# Altium footprint library AD_Comments.PcbLib: 178 footprints (part 2 of 12)
Each footprint in its own frame and in the unit in brackets; x right, y up, seen from the top. Pads: shape width x height; smd on the part's side, far side on the other; paste and mask are expansions set on the pad; w line width, h text height; cw(c..) or ccw(c..) is an arc to the next point about the centre after c.
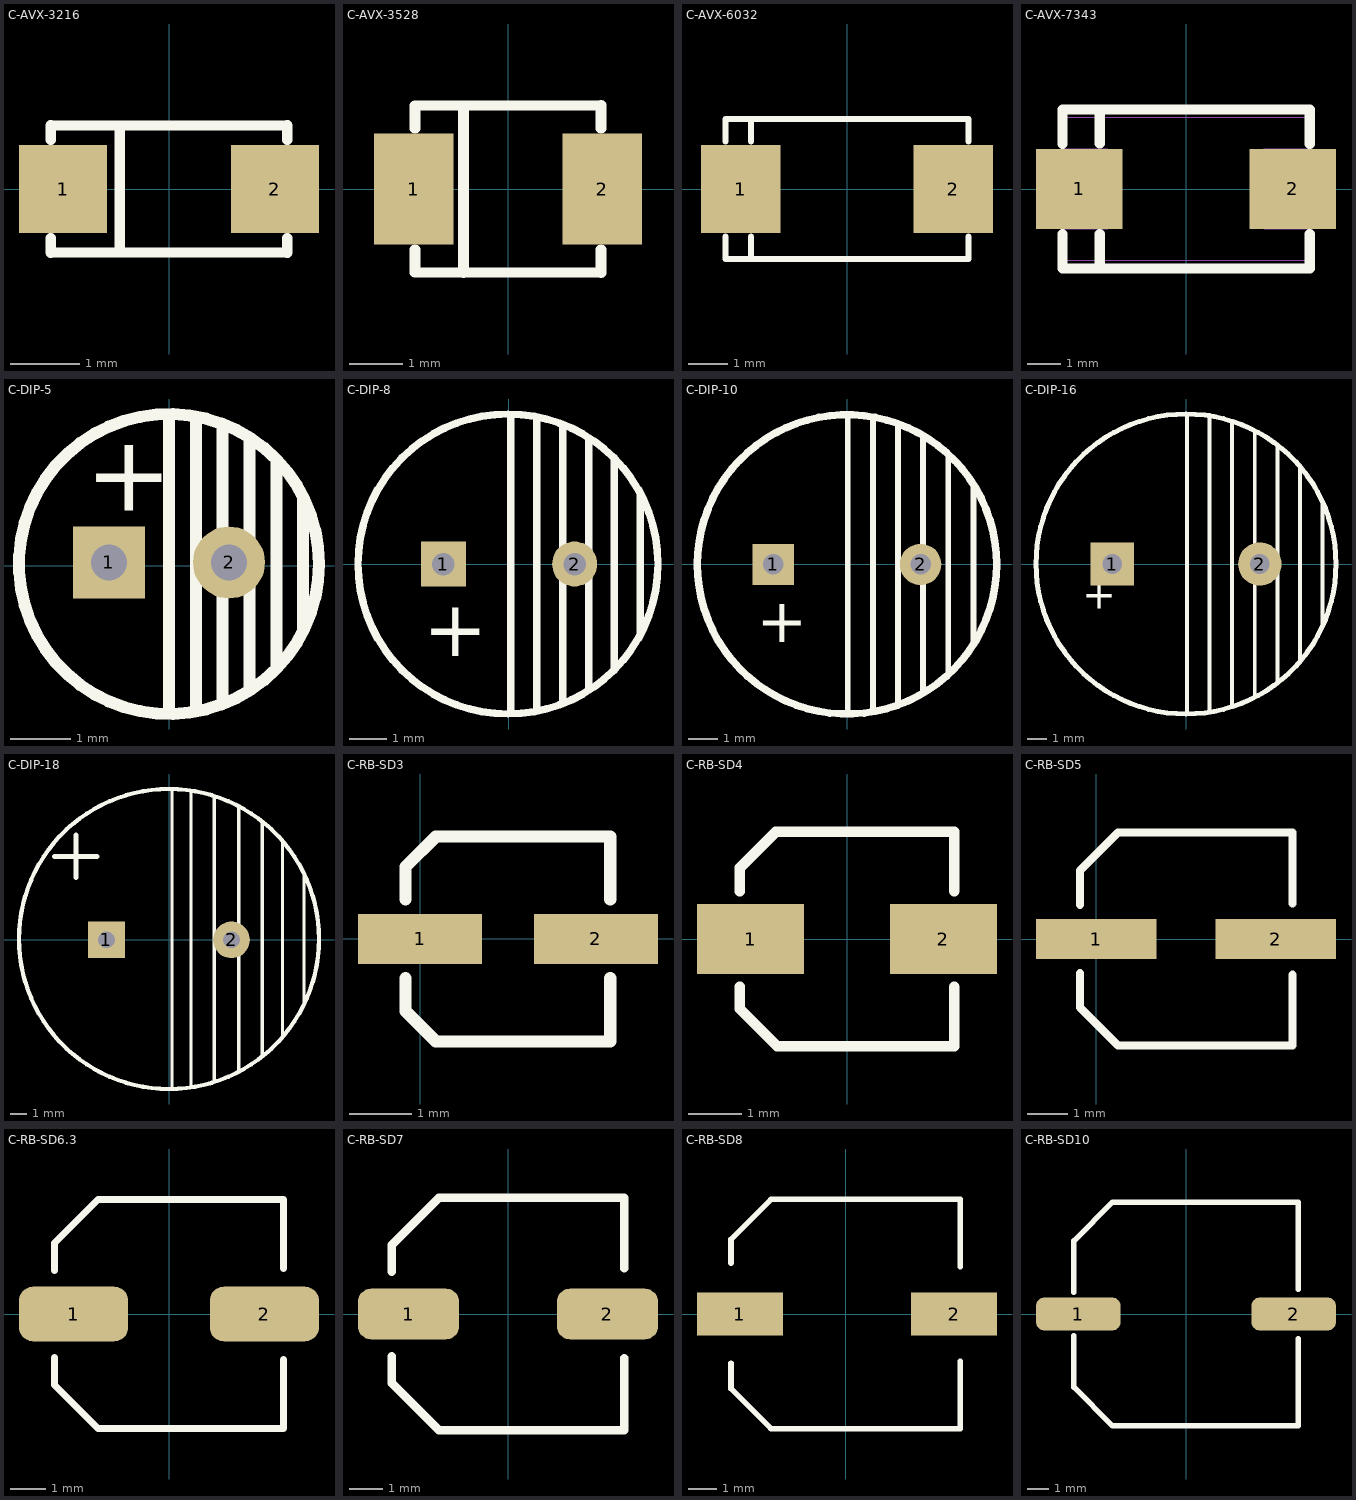
[diagram p1: the footprints below, top view; thin cyan lines are the x and y axes]

## C-AVX-3216 [mil] "钽电容3.2*1.6mm"
height 78.74
pads (2):
  rect 50x50 smd: 1(-60,0) 2(60,0)
Top Overlay:
  lines w5.91: -67,-36 67,-36 ; -67,36 67,36
  lines w6: -67,-36 -67,-28 ; -67,28 -67,36 ; -28,-35 -28,35 ; 67,-36 67,-28 ; 67,28 67,36
3D body "User Library-AVX_ACASE.step": height 67.32, standoff 0, extent -66.92,-33.06 66.94,33.08

## C-AVX-3528 [mm] "钽电容3.5*2.8mm"
height 3
pads (2):
  rect 1.5x2.1 smd: 1(-1.778,0) 2(1.778,0)
Top Overlay:
  lines w0.2: -1.753,-1.143 -1.753,-1.572 1.753,-1.578 1.753,-1.143 ; -1.753,1.143 -1.753,1.572 1.753,1.578 1.753,1.143 ; -0.838,-1.575 -0.838,1.549
3D body "User Library-AVX_BCASE.step": height 2.03, standoff 0, extent -1.85,-1.465 1.85,1.465

## C-AVX-6032 [mm] "钽电容6*3.2mm"
pads (2):
  rect 2x2.2 smd: 1(-2.667,0) 2(2.667,0)
Top Overlay:
  lines w0.152: -3.048,-1.194 -3.048,-1.753 3.048,-1.753 3.048,-1.194 ; -3.048,1.194 -3.048,1.753 3.048,1.753 3.048,1.194 ; -2.413,-1.676 -2.413,-1.194 ; -2.413,1.194 -2.413,1.753
3D body "User Library-AVX_C_CASE.step": height 2.7, standoff 0, extent -3.05,-1.675 3.05,1.675

## C-AVX-7343 [mm] "钽电容7.3*4.3mm 低密度"
height 4
pads (2):
  rect 2.6x2.4 smd: 1(-3.202,0.007) 2(3.198,0.007)
Top Overlay:
  lines w0.305: -3.708,-1.346 -3.708,-2.388 3.708,-2.388 3.708,-1.346 ; -3.708,1.346 -3.708,2.388 3.708,2.388 3.708,1.346 ; -2.591,-2.388 -2.591,-1.346 ; -2.591,1.36 -2.591,2.337
Mechanical 7:
  lines w0.025: -3.651,-1.192 -2.351,-1.192 -2.351,1.208 -3.651,1.208 ; 3.649,-1.192 2.349,-1.192 2.349,1.208 3.649,1.208 ; -3.651,-2.142 -3.651,2.158 3.649,2.158 3.649,-2.142 -3.651,-2.142
3D body "User Library-AVX_D_CASE.step": height 3.01, standoff 0, extent -3.7,-2.225 3.7,2.225

## C-DIP-5 [mm] "2.5*5*11mm  22uF/50V"
pads (2):
  rect 1.2x1.2 hole 0.6: 1(-1,0.051)
  round 1.2 hole 0.6: 2(1,0.051)
Top Overlay:
  circle w0.2: c0,0.025 r2.5
  lines w0.2: 0,-2.464 0,2.489 ; 0.447,-2.413 0.447,2.464 ; 0.894,-2.261 0.894,2.362 ; 1.341,-2.007 1.341,2.057 ; 1.788,-1.651 1.788,1.753 ; 2.235,-1.067 2.235,1.092
  text "+" at -1.397,0.914 h1.27
3D body "User Library-cap 5x11.STEP": height 11, standoff -19, extent -2.5,-2.485 2.5,2.515

## C-DIP-8 [mm] "3.5*8*12mm  470uF/25V"
height 12
pads (2):
  rect 1.2x1.2 hole 0.6: 1(-1.75,0)
  round 1.2 hole 0.6: 2(1.75,0)
Top Overlay:
  circle w0.2: c-0.025,0 r4
  lines w0.2: 0.051,-3.937 0.051,3.962 ; 0.742,-3.912 0.742,3.912 ; 1.433,-3.683 1.433,3.708 ; 2.123,-3.302 2.123,3.327 ; 2.814,-2.794 2.814,2.819 ; 3.505,-1.803 3.505,1.88
  text "+" at -2.282,-2.464 h1.5
3D body "SW3dPS-Cap electro 8x11.5x3.5mm.STEP": height 11.83, standoff -3.68, extent -4.025,-4.026 4.025,4.025

## C-DIP-10 [mm] "5*10*17mm  470uF/35V 1000uF/25V"
height 17
pads (2):
  rect 1.4x1.4 hole 0.7: 1(-2.5,0)
  round 1.4 hole 0.7: 2(2.5,0)
Top Overlay:
  circle w0.254: c0,0 r5.08
  lines w0.2: 0.025,-5.055 0.025,5.105 ; 0.879,-4.953 0.879,4.978 ; 1.732,-4.674 1.732,4.75 ; 2.586,-4.267 2.586,4.293 ; 3.439,-3.632 3.439,3.708 ; 4.293,-2.667 4.293,2.667
  text "+" at -3.07,-2.642 h1.5
3D body "CAP 101.STEP": height 13, standoff -13.8, extent -5.4,-5.4 5.41,5.4

## C-DIP-16 [mm] "7.5*15*25mm  2200uF/35V"
pads (2):
  rect 2.2x2.2 hole 1: 1(-3.75,0)
  round 2.2 hole 1: 2(3.75,0)
Top Overlay:
  circle w0.254: c0,0 r7.62
  lines w0.2: 0.051,-7.595 0.051,7.595 ; 1.198,-7.442 1.198,7.569 ; 2.345,-7.239 2.345,7.188 ; 3.492,-6.706 3.492,6.782 ; 4.64,-5.918 4.64,5.994 ; 5.787,-4.877 5.787,4.953 ; 6.934,-3.175 6.934,3.073
  text "+" at -3.556,-0.965 h1.5
3D body "35V2200UF.STEP": height 26, standoff -3, extent -8,-8 8,8

## C-DIP-18 [mm] "10*20*31.5mm  4700uF/50V"
height 31.5
pads (2):
  rect 2.2x2.2 hole 1: 1(-3.75,0)
  round 2.2 hole 1: 2(3.75,0)
Top Overlay:
  circle w0.254: c0,0.051 r9
  lines w0.2: 0.178,-8.941 0.178,9.042 ; 1.321,-8.763 1.321,8.915 ; 2.718,-8.484 2.718,8.534 ; 4.191,-7.798 4.191,7.95 ; 5.588,-6.96 5.588,6.96 ; 6.807,-5.74 6.807,5.918 ; 8.103,-3.81 8.103,3.962
  lines w0.305: -6.858,5.004 -4.318,5.004 ; -5.588,3.734 -5.588,6.274
3D body "User Library-CE_R300_D720_H1600.STEP": height 41.36, standoff -2.78, extent -9.14,-9.138 9.14,9.138

## C-RB-SD3 [mm]
pads (2):
  rect 2x0.8 smd: 1(0,0) 2(2.835,0)
Top Overlay:
  lines w0.2: -0.234,-0.635 -0.234,-1.163 0.256,-1.653 3.059,-1.653 ; -0.234,0.635 -0.234,1.163 0.254,1.651 3.066,1.651 3.066,0.635 ; 3.066,-1.647 3.066,-0.635
3D body "User Library-ALU-A.STEP": height 5.4, standoff 0, extent -0.378,-1.65 3.222,1.65

## C-RB-SD4 [mm] "贴片铝电解"
height 7
pads (2):
  rect 2x1.3 smd: 1(-1.8,0) 2(1.8,0)
Top Overlay:
  lines w0.2: -2,-0.889 -2,-1.302 -1.302,-2 2,-2 2,-0.896 ; -2,0.889 -2,1.327 -1.327,2 2,2 2,0.896
3D body "SL-B.STEP": height 5.2, standoff 0, extent -2.3,-2.15 2.3,2.15

## C-RB-SD5 [mm]
pads (2):
  rect 3x1 smd: 1(0,0) 2(4.477,0)
Top Overlay:
  lines w0.203: -0.407,-0.852 -0.407,-1.706 ; -0.407,0.854 -0.407,1.707 0.541,2.655 0.542,2.656 4.89,2.656 ; 0.217,-2.33 -0.407,-1.706 ; 4.891,-2.654 0.542,-2.654 0.542,-2.654 -0.407,-1.706 ; 4.892,-2.654 4.892,-0.889 ; 4.892,0.889 4.892,2.654
3D body "SL-D.STEP": height 5.2, standoff 0, extent -0.545,-2.591 5.055,2.709

## C-RB-SD6.3 [mil] "贴片铝电解"
height 275.59
pads (2):
  rrect50% 120x60 smd: 1(-105,0) 2(105,0)
Top Overlay:
  lines w7.87: -125.98,-48 -125.98,-78.02 -78.02,-125.98 125.98,-125.98 125.98,-50 ; -125.98,48 -125.98,78.02 -78.02,125.98 125.98,125.98 125.98,50
3D body "SL-E.STEP": height 204.72, standoff 0, extent -137.79,-129.92 137.8,129.92

## C-RB-SD7 [mil]
pads (2):
  rrect50% 120x60 smd: 1(-118.11,0) 2(118.11,0)
Top Overlay:
  lines w10: -137.8,-50 -137.8,-82.2 -82.2,-137.8 137.8,-137.8 137.8,-52.2 ; -137.8,50.2 -137.8,82.2 -82.2,137.8 137.8,137.8 137.8,54
3D body "User Library-ALU-D.STEP": height 212.6, standoff 0, extent -137.8,-129.92 137.79,129.92

## C-RB-SD8 [mm] "贴片铝电解"
height 10.2
pads (2):
  rect 3x1.5 smd: 1(-3.683,0) 2(3.785,0)
Top Overlay:
  lines w0.2: -4,-1.714 -4,-2.604 -2.604,-4 4,-4 4,-1.651 ; -4,1.778 -4,2.604 -2.604,4 4,4 4,1.651
3D body "User Library-ALU-E.STEP": height 6.2, standoff 0, extent -4.5,-4.15 4.5,4.15

## C-RB-SD10 [mil] "贴片铝电解"
height 401.57
pads (2):
  rrect50% 155x60 smd: 1(-196.85,0) 2(196.85,0)
Top Overlay:
  lines w10: -205,-40 -205,-133.72 -134,-204.72 204.28,-204.72 205,-204 205,-45 ; -205,40 -205,134 ; -204.35,134.37 -134,204.72 204.28,204.72 205,204 205,45
3D body "SW3dPS-capacitor size G.STEP": height 401.77, standoff -0.2, extent -227.35,-201.51 229.35,204